# Altium schematic symbol library relay.SCHLIB: 425 symbols (part 1 of 3)
Pins are listed as number, name and electrical type; pins without a type are passive.

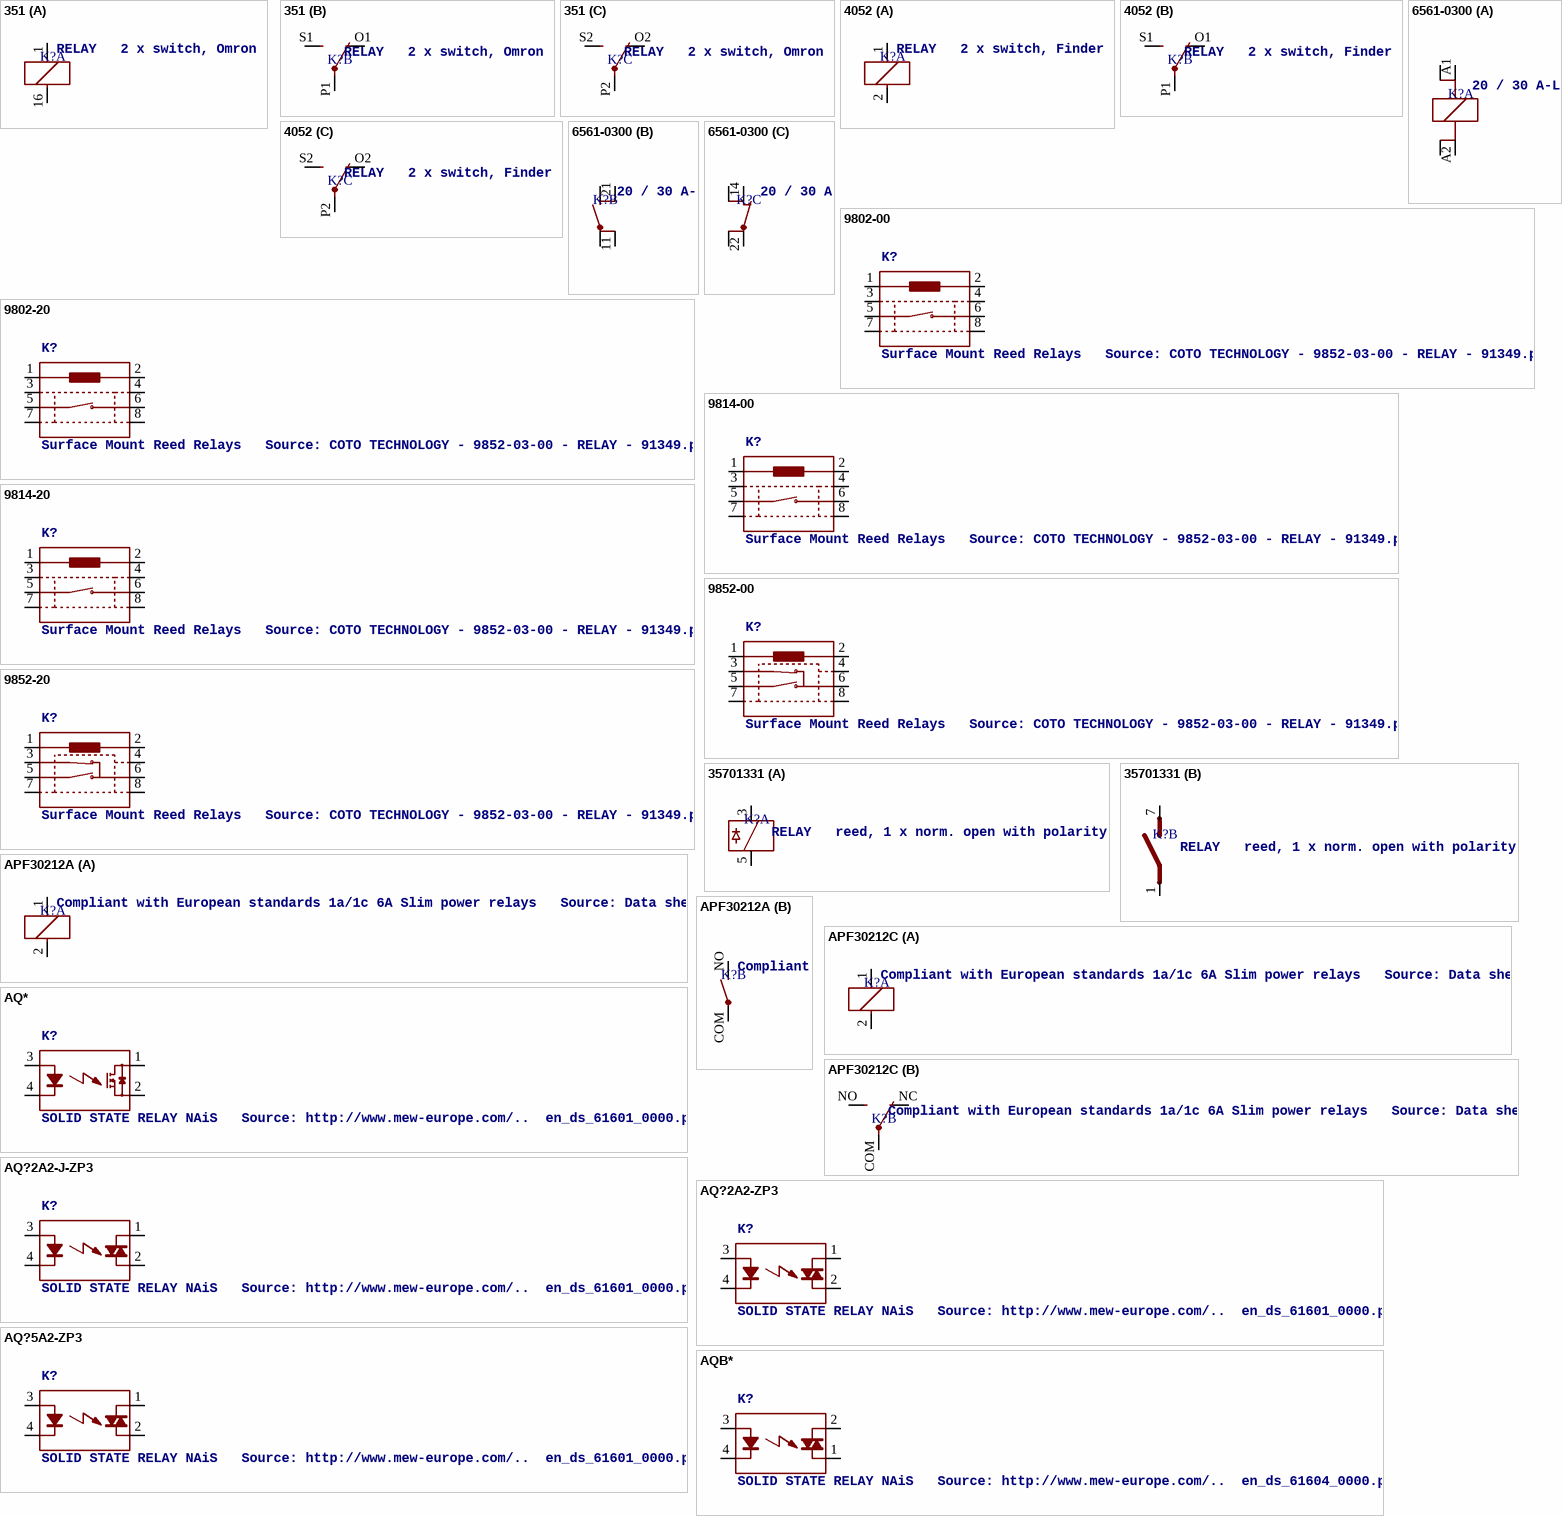
[diagram p0: symbols 351 to AQB*]

## 351
designator K?, comment RELAY   2 x switch, Omron
OC_FARNELL: unknown; OC_NEWARK: unknown
footprint 351
part A pins: 1, 16 2
part B pins: O1 O, P1 P, S1 S
part C pins: O2 O, P2 P, S2 S

## 4052
designator K?, comment RELAY   2 x switch, Finder
OC_FARNELL: unknown; OC_NEWARK: unknown
footprint F4052
part A pins: 1, 2
part B pins: O1 O, P1 P, S1 S
part C pins: O2 O, P2 P, S2 S

## 6561-0300
designator K?, comment 20 / 30 A-Leistungsrelais   Source: http://www.finder.de/comuni/pdf/S65DE.pdf
OC_FARNELL: unknown; OC_NEWARK: unknown
footprint 6561-0300
part A pins: A1 1_, A1_ 1, A2 2_, A2_ 2
part B pins: 11 P_, 11_ P, 21 S_, 21_ S
part C pins: 14 O, 14_ O_, 22 P, 22_ P_

## 9802-00
designator K?, comment Surface Mount Reed Relays   Source: COTO TECHNOLOGY - 9852-03-00 - RELAY - 91349.pdf
OC_FARNELL: unknown; OC_NEWARK: unknown; MF: COTO TECHNOLOGY; MPN: 9802-05-00; OC_FARNELL: 1081689; OC_NEWARK: 16F3689
footprint 9802-00
pins: 1, 2, 3, 4, 5, 6, 7, 8

## 9802-20
designator K?, comment Surface Mount Reed Relays   Source: COTO TECHNOLOGY - 9852-03-00 - RELAY - 91349.pdf
OC_FARNELL: unknown; OC_NEWARK: unknown; MF: COTO TECHNOLOGY; MPN: 9802-05-20; OC_FARNELL: 1081633; OC_NEWARK: 92F3367
footprint 9802-20
pins: 1, 2, 3, 4, 5, 6, 7, 8

## 9814-00
designator K?, comment Surface Mount Reed Relays   Source: COTO TECHNOLOGY - 9852-03-00 - RELAY - 91349.pdf
MF: COTO TECHNOLOGY; MPN: 9814-03-00; OC_FARNELL: unknown; OC_NEWARK: 29H2537; MPN: 9814-05-00; OC_FARNELL: 1081691; OC_NEWARK: 29H2538
footprint 9814-00
pins: 1, 2, 3, 4, 5, 6, 7, 8

## 9814-20
designator K?, comment Surface Mount Reed Relays   Source: COTO TECHNOLOGY - 9852-03-00 - RELAY - 91349.pdf
MF: COTO TECHNOLOGY; MPN: 9814-03-20; OC_FARNELL: unknown; OC_NEWARK: 83H2026; MPN: 9814-05-20; OC_NEWARK: 83H2028
footprint 9814-20
pins: 1, 2, 3, 4, 5, 6, 7, 8

## 9852-00
designator K?, comment Surface Mount Reed Relays   Source: COTO TECHNOLOGY - 9852-03-00 - RELAY - 91349.pdf
MF: COTO TECHNOLOGY; MPN: 9852-03-00; OC_FARNELL: 1081692; OC_NEWARK: 29H2540; MPN: 9852-05-00; OC_FARNELL: 1081693; OC_NEWARK: 84C8955
footprint 9852-00
pins: 1, 2, 3, 4, 5, 6, 7, 8

## 9852-20
designator K?, comment Surface Mount Reed Relays   Source: COTO TECHNOLOGY - 9852-03-00 - RELAY - 91349.pdf
MF: COTO TECHNOLOGY; MPN: 9852-03-20; OC_FARNELL: unknown; OC_NEWARK: 83H2030; MPN: 9852-05-20; OC_FARNELL: 1081642; OC_NEWARK: 46M4523
footprint 9852-20
pins: 1, 2, 3, 4, 5, 6, 7, 8

## 35701331
designator K?, comment RELAY   reed, 1 x norm. open with polarity
OC_FARNELL: unknown; OC_NEWARK: unknown
footprint REED
part A pins: 3, 5
part B pins: 1 P, 7 S

## APF30212A
designator K?, comment Compliant with European standards 1a/1c 6A Slim power relays   Source: Data sheet
OC_FARNELL: unknown
footprint APF30212A
part A pins: 1, 2
part B pins: COM P, NO S

## APF30212C
designator K?, comment Compliant with European standards 1a/1c 6A Slim power relays   Source: Data sheet
OC_FARNELL: unknown
footprint APF30212C
part A pins: 1, 2
part B pins: COM P, NC O, NO S

## AQ*
designator K?, comment SOLID STATE RELAY NAiS   Source: http://www.mew-europe.com/..  en_ds_61601_0000.pdf
MPN: AQ1AD2-3/28VDC; MPN: AQ2AD1-3/28VDC; MF: AROMAT/ MATSUSHITA; OC_FARNELL: unknown; OC_NEWARK: 10C4052; OC_NEWARK: 13P1229
footprint AQ1
pins: 1 DS1, 2 DS2, 3 A, 4 K

## AQ?2A2-J-ZP3
designator K?, comment SOLID STATE RELAY NAiS   Source: http://www.mew-europe.com/..  en_ds_61601_0000.pdf
MPN: AQ2A2-ZP3/28VDC; OC_FARNELL: 1163552; OC_NEWARK: 13P1232
footprint AQ1-FLAT
pins: 1 DS1, 2 DS2, 3 A, 4 K

## AQ?2A2-ZP3
designator K?, comment SOLID STATE RELAY NAiS   Source: http://www.mew-europe.com/..  en_ds_61601_0000.pdf
MPN: AQ2A2-ZP3/28VDC; OC_FARNELL: 1163552; OC_NEWARK: 13P1232
footprint AQ1
pins: 1 DS1, 2 DS2, 3 A, 4 K

## AQ?5A2-ZP3
designator K?, comment SOLID STATE RELAY NAiS   Source: http://www.mew-europe.com/..  en_ds_61601_0000.pdf
MPN: AQ5A2-ZP3/28VDC; OC_FARNELL: unknown; OC_NEWARK: 13P1233
footprint AQ1-M
pins: 1 DS1, 2 DS2, 3 A, 4 K

## AQB*
designator K?, comment SOLID STATE RELAY NAiS   Source: http://www.mew-europe.com/..  en_ds_61604_0000.pdf
OC_FARNELL: unknown; OC_NEWARK: unknown
footprint AQ-B
pins: 1 DS2, 2 DS1, 3 A, 4 K

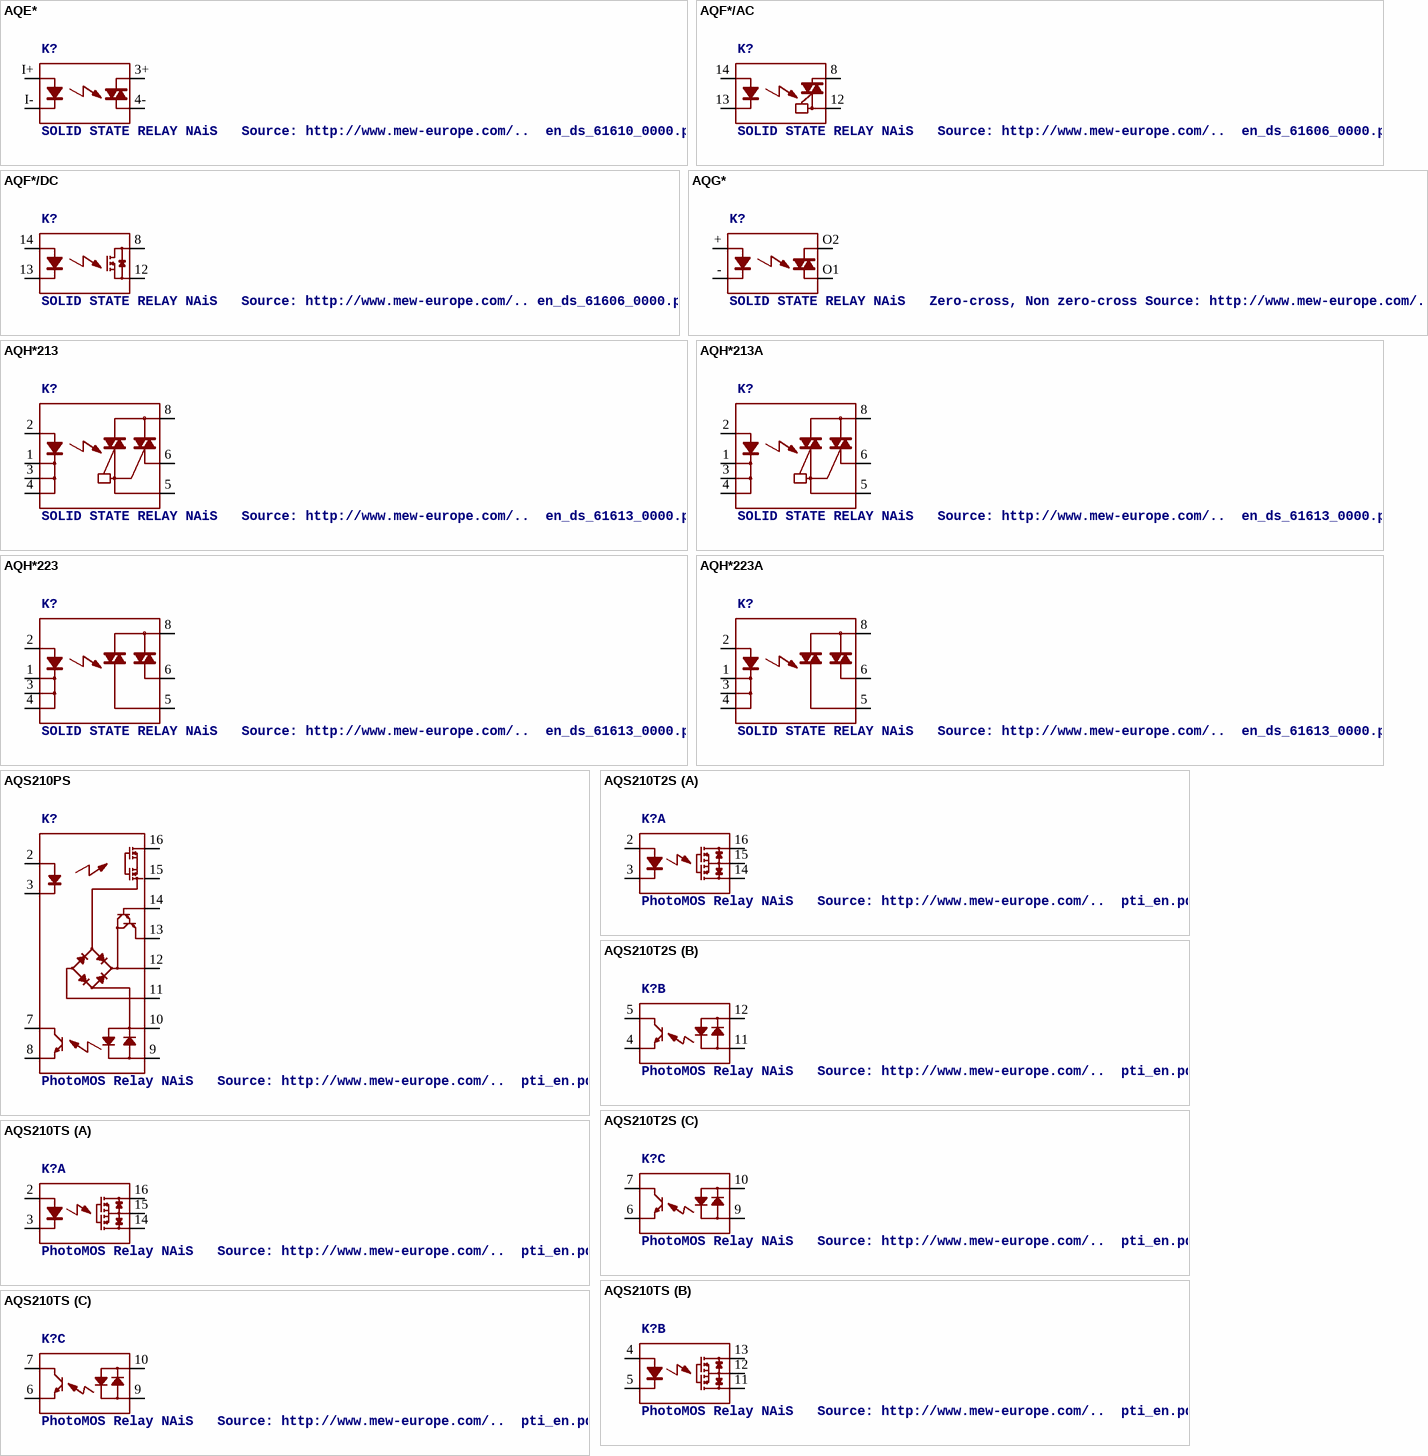
[diagram p1: symbols AQE* to AQS210TS]

## AQE*
designator K?, comment SOLID STATE RELAY NAiS   Source: http://www.mew-europe.com/..  en_ds_61610_0000.pdf
OC_FARNELL: unknown; OC_NEWARK: unknown
footprint AQE
pins: 3+ DS1, 4- DS2, I+ A, I- K

## AQF*/AC
designator K?, comment SOLID STATE RELAY NAiS   Source: http://www.mew-europe.com/..  en_ds_61606_0000.pdf
OC_FARNELL: unknown; OC_NEWARK: unknown
footprint HC2-PS-K
pins: 8 DS1, 12 DS2, 13 K, 14 A

## AQF*/DC
designator K?, comment SOLID STATE RELAY NAiS   Source: http://www.mew-europe.com/.. en_ds_61606_0000.pdf
OC_FARNELL: unknown; OC_NEWARK: unknown
footprint HC2-PS-K
pins: 8 DS1, 12 DS2, 13 K, 14 A

## AQG*
designator K?, comment SOLID STATE RELAY NAiS   Zero-cross, Non zero-cross Source: http://www.mew-europe.com/.. en_ds_61611_0000.pdf
MPN: AQG12105; MPN: AQG12112; MPN: AQG12124; MPN: AQG12205; MPN: AQG12212; MPN: AQG12224; MPN: AQG22105; MPN: AQG22124; MPN: AQG22205; MPN: AQG22212; MPN: AQG22224; MF: AROMAT/ MATSUSHITA; OC_FARNELL: unknown; OC_NEWARK: 20J4759; OC_NEWARK: 11N2581; OC_NEWARK: 11J1737; OC_NEWARK: 11N2582; OC_NEWARK: 11N2583; OC_NEWARK: 11N2584; OC_NEWARK: 13P0946; OC_NEWARK: unknown; OC_NEWARK: 11N2586; OC_NEWARK: 11N2587; OC_NEWARK: 11N2588; OC_NEWARK: 11N2589
footprint AQG
pins: + A, - K, O1 DS2, O2 DS1

## AQH*213
designator K?, comment SOLID STATE RELAY NAiS   Source: http://www.mew-europe.com/..  en_ds_61613_0000.pdf
OC_FARNELL: unknown; OC_NEWARK: unknown
footprint DIL07
pins: 1 K, 2 A, 3 K1, 4 K2, 5 DS2, 6 DS3, 8 DS1

## AQH*213A
designator K?, comment SOLID STATE RELAY NAiS   Source: http://www.mew-europe.com/..  en_ds_61613_0000.pdf
OC_FARNELL: unknown; OC_NEWARK: unknown
footprint DIL07SMD
pins: 1 K, 2 A, 3 K1, 4 K2, 5 DS2, 6 DS3, 8 DS1

## AQH*223
designator K?, comment SOLID STATE RELAY NAiS   Source: http://www.mew-europe.com/..  en_ds_61613_0000.pdf
MPN: AQH1223; MPN: AQH2223; MF: AROMAT/ MATSUSHITA; OC_FARNELL: unknown; OC_NEWARK: 54K4251; OC_NEWARK: 26K3059
footprint DIL07
pins: 1 K, 2 A, 3 K1, 4 K2, 5 DS2, 6 DS3, 8 DS1

## AQH*223A
designator K?, comment SOLID STATE RELAY NAiS   Source: http://www.mew-europe.com/..  en_ds_61613_0000.pdf
MPN: AQH1223A; MPN: AQH2223A; MF: AROMAT/ MATSUSHITA; OC_FARNELL: unknown; OC_NEWARK: 11N2601; OC_NEWARK: 26K3060
footprint DIL07SMD
pins: 1 K, 2 A, 3 K1, 4 K2, 5 DS2, 6 DS3, 8 DS1

## AQS210PS
designator K?, comment PhotoMOS Relay NAiS   Source: http://www.mew-europe.com/..  pti_en.pdf
OC_FARNELL: unknown; OC_NEWARK: unknown
footprint SOP16
pins: 2, 3, 7, 8, 9, 10, 11, 12, 13, 14, 15, 16

## AQS210T2S
designator K?, comment PhotoMOS Relay NAiS   Source: http://www.mew-europe.com/..  pti_en.pdf
OC_FARNELL: unknown; OC_NEWARK: unknown
footprint SOP16
part A pins: 2 A, 3 K, 14 D2, 15 S, 16 D1
part B pins: 4 E, 5 K, 11 AC2, 12 AC1
part C pins: 6 E, 7 K, 9 AC2, 10 AC1

## AQS210TS
designator K?, comment PhotoMOS Relay NAiS   Source: http://www.mew-europe.com/..  pti_en.pdf
OC_FARNELL: unknown; OC_NEWARK: unknown
footprint SOP16
part A pins: 2 A, 3 K, 14 D2, 15 S, 16 D1
part B pins: 4 A, 5 K, 11 D2, 12 S, 13 D1
part C pins: 6 E, 7 K, 9 AC2, 10 AC1

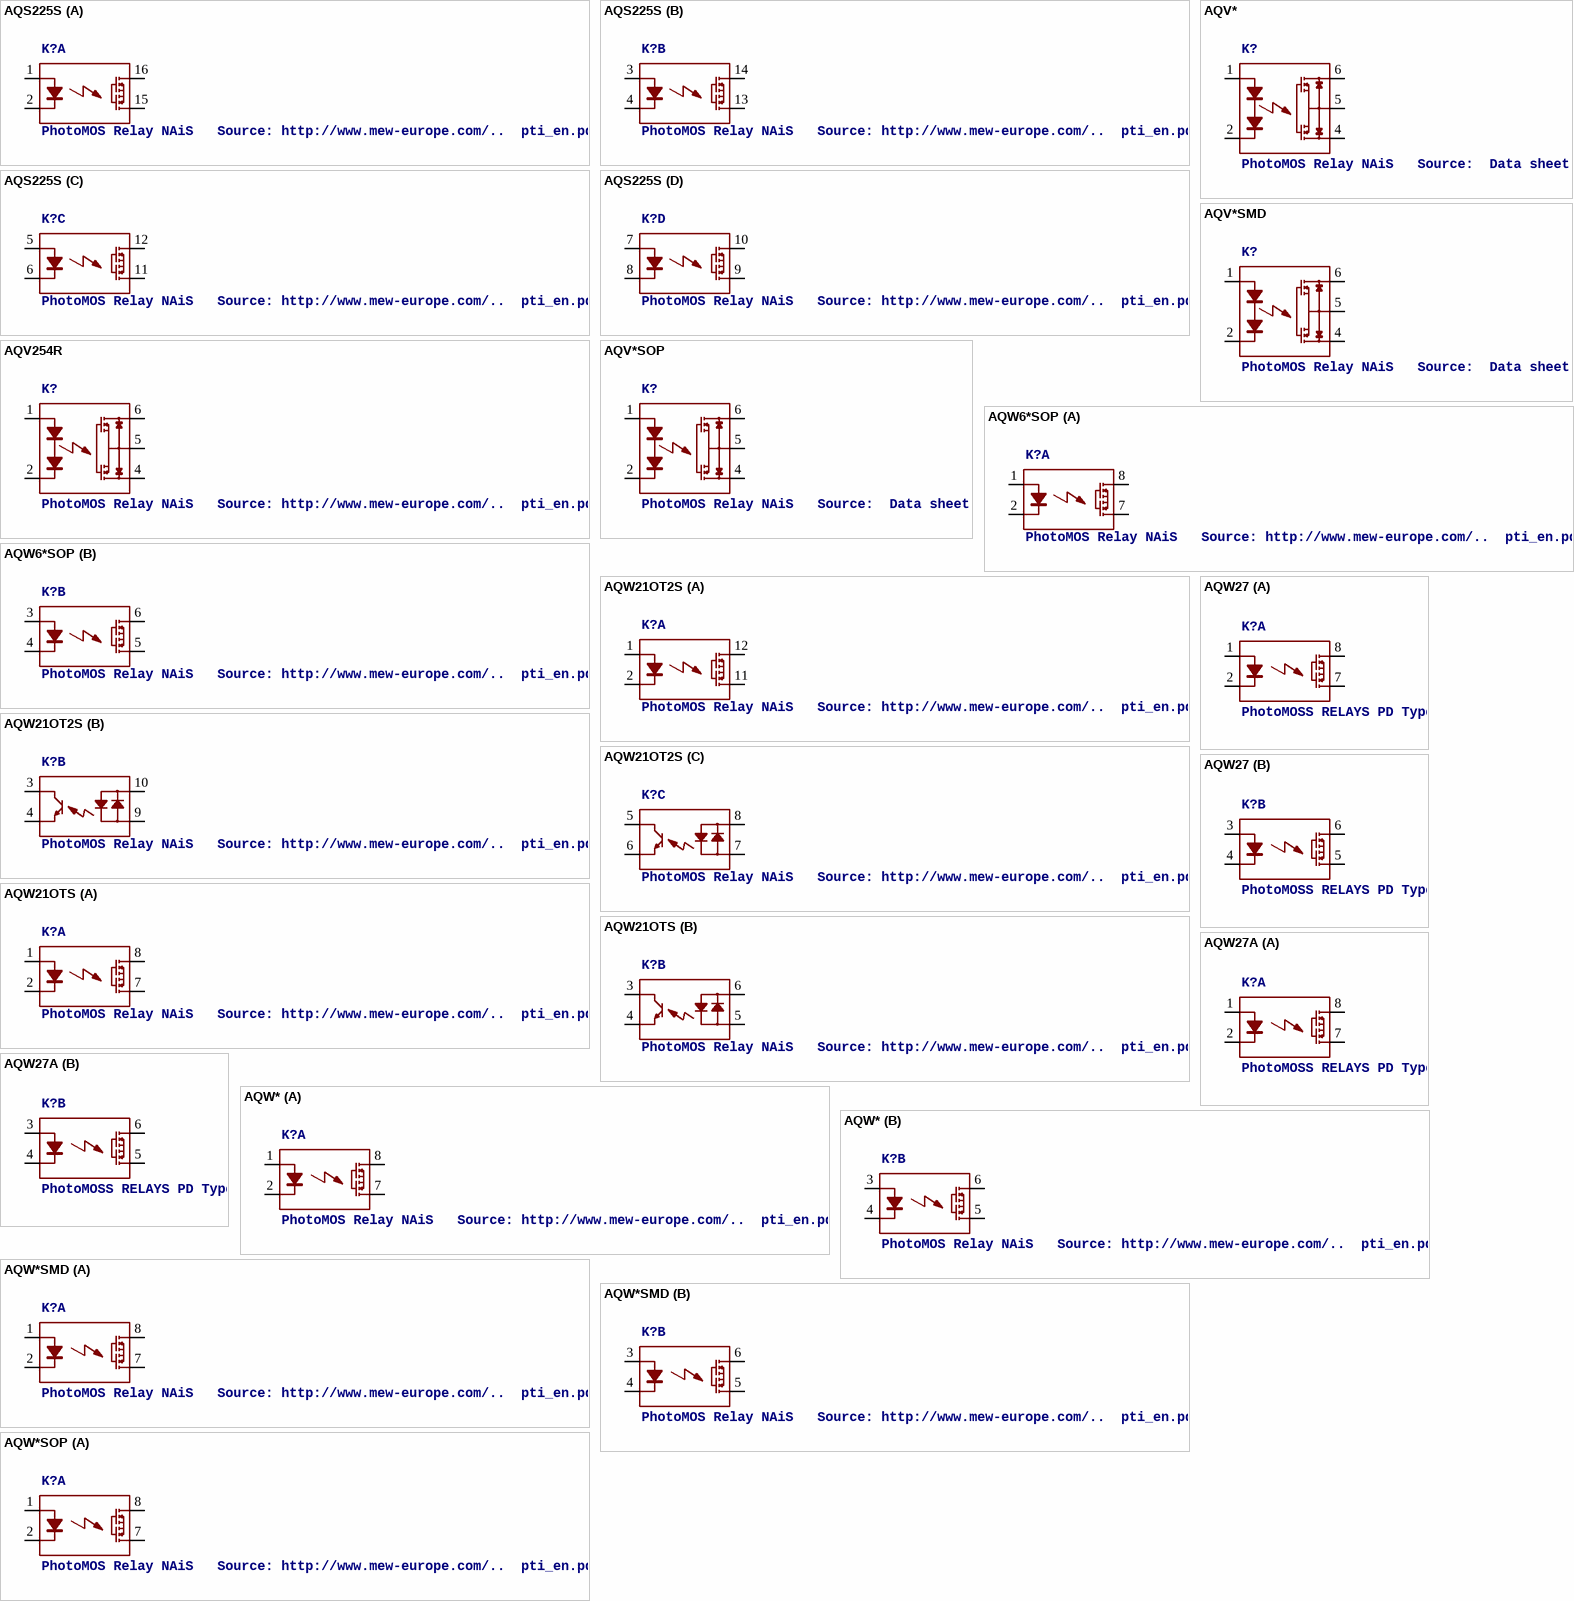
[diagram p2: symbols AQS225S to AQW*SOP]

## AQS225S
designator K?, comment PhotoMOS Relay NAiS   Source: http://www.mew-europe.com/..  pti_en.pdf
MPN: AQS225S; MF: AROMAT/ MATSUSHITA; OC_FARNELL: 1448339; OC_NEWARK: 10C3715
footprint SOP16
part A pins: 1 A, 2 K, 15 DS2, 16 DS1
part B pins: 3 A, 4 K, 13 DS2, 14 DS1
part C pins: 5 A, 6 K, 11 DS2, 12 DS1
part D pins: 7 A, 8 K, 9 DS2, 10 DS1

## AQV254R
designator K?, comment PhotoMOS Relay NAiS   Source: http://www.mew-europe.com/..  pti_en.pdf
MPN: AQV254; MF: AROMAT/ MATSUSHITA; OC_FARNELL: 1124063; OC_NEWARK: 93F6300
footprint DIL06
pins: 1 A, 2 K, 4 D2, 5 S, 6 D1

## AQV*
designator K?, comment PhotoMOS Relay NAiS   Source:  Data sheet
MPN: AQV102; MPN: AQV201; MPN: AQV210; MPN: AQV234; MF: AROMAT/ MATSUSHITA; OC_FARNELL: 2006029; OC_NEWARK: 94F8718; OC_FARNELL: 1704180; OC_NEWARK: 50F4048; OC_FARNELL: 1704179; OC_NEWARK: 13P0968; OC_FARNELL: 1414197; OC_NEWARK: unknown; OC_FARNELL: unknown; OC_NEWARK: 13P1031
footprint DIL06
pins: 1 A, 2 K, 4 D2, 5 S, 6 D1

## AQV*SMD
designator K?, comment PhotoMOS Relay NAiS   Source:  Data sheet
MPN: AQV210S; MF: AROMAT/ MATSUSHITA; OC_FARNELL: unknown; OC_NEWARK: 95F6433; OC_NEWARK: unknown
footprint DIL06SMD
pins: 1 A, 2 K, 4 D2, 5 S, 6 D1

## AQV*SOP
designator K?, comment PhotoMOS Relay NAiS   Source:  Data sheet
OC_FARNELL: unknown; OC_NEWARK: unknown
footprint SOP06
pins: 1 A, 2 K, 4 D2, 5 S, 6 D1

## AQW6*SOP
designator K?, comment PhotoMOS Relay NAiS   Source: http://www.mew-europe.com/..  pti_en.pdf
OC_FARNELL: unknown; OC_NEWARK: unknown
footprint SOP08
part A pins: 1 A, 2 K, 7 DS2, 8 DS1
part B pins: 3 A, 4 K, 5 DS2, 6 DS1

## AQW21OT2S
designator K?, comment PhotoMOS Relay NAiS   Source: http://www.mew-europe.com/..  pti_en.pdf
OC_FARNELL: unknown; OC_NEWARK: unknown
footprint SOP12
part A pins: 1 A, 2 K, 11 DS2, 12 DS1
part B pins: 3 K, 4 E, 9 AC2, 10 AC1
part C pins: 5 K, 6 E, 7 AC2, 8 AC1

## AQW21OTS
designator K?, comment PhotoMOS Relay NAiS   Source: http://www.mew-europe.com/..  pti_en.pdf
OC_FARNELL: unknown; OC_NEWARK: unknown
footprint SOP08
part A pins: 1 A, 2 K, 7 DS2, 8 DS1
part B pins: 3 K, 4 E, 5 AC2, 6 AC1

## AQW27
designator K?, comment PhotoMOSS RELAYS PD Type 2- channel (Form a) Type   Source: http://www.ic-on-line.cn/IOL/datasheet/aqw277az_1212830.pdf
footprint AQW27-DIL08
part A pins: 1 A, 2 K, 7 D2, 8 D1
part B pins: 3 A, 4 K, 5 D2, 6 D1

## AQW27A
designator K?, comment PhotoMOSS RELAYS PD Type 2- channel (Form a) Type   Source: http://www.ic-on-line.cn/IOL/datasheet/aqw277az_1212830.pdf
footprint AQW27-SMD08
part A pins: 1 A, 2 K, 7 D2, 8 D1
part B pins: 3 A, 4 K, 5 D2, 6 D1

## AQW*
designator K?, comment PhotoMOS Relay NAiS   Source: http://www.mew-europe.com/..  pti_en.pdf
MPN: AQW654; OC_FARNELL: unknown; OC_NEWARK: unknown; OC_NEWARK: 13P1160
footprint DIL08
part A pins: 1 A, 2 K, 7 D2, 8 D1
part B pins: 3 A, 4 K, 5 D2, 6 D1

## AQW*SMD
designator K?, comment PhotoMOS Relay NAiS   Source: http://www.mew-europe.com/..  pti_en.pdf
MPN: AQW654; MF: AROMAT/ MATSUSHITA; OC_FARNELL: unknown; OC_NEWARK: 98B6279
footprint DIL08SMD
part A pins: 1 A, 2 K, 7 D2, 8 D1
part B pins: 3 A, 4 K, 5 D2, 6 D1

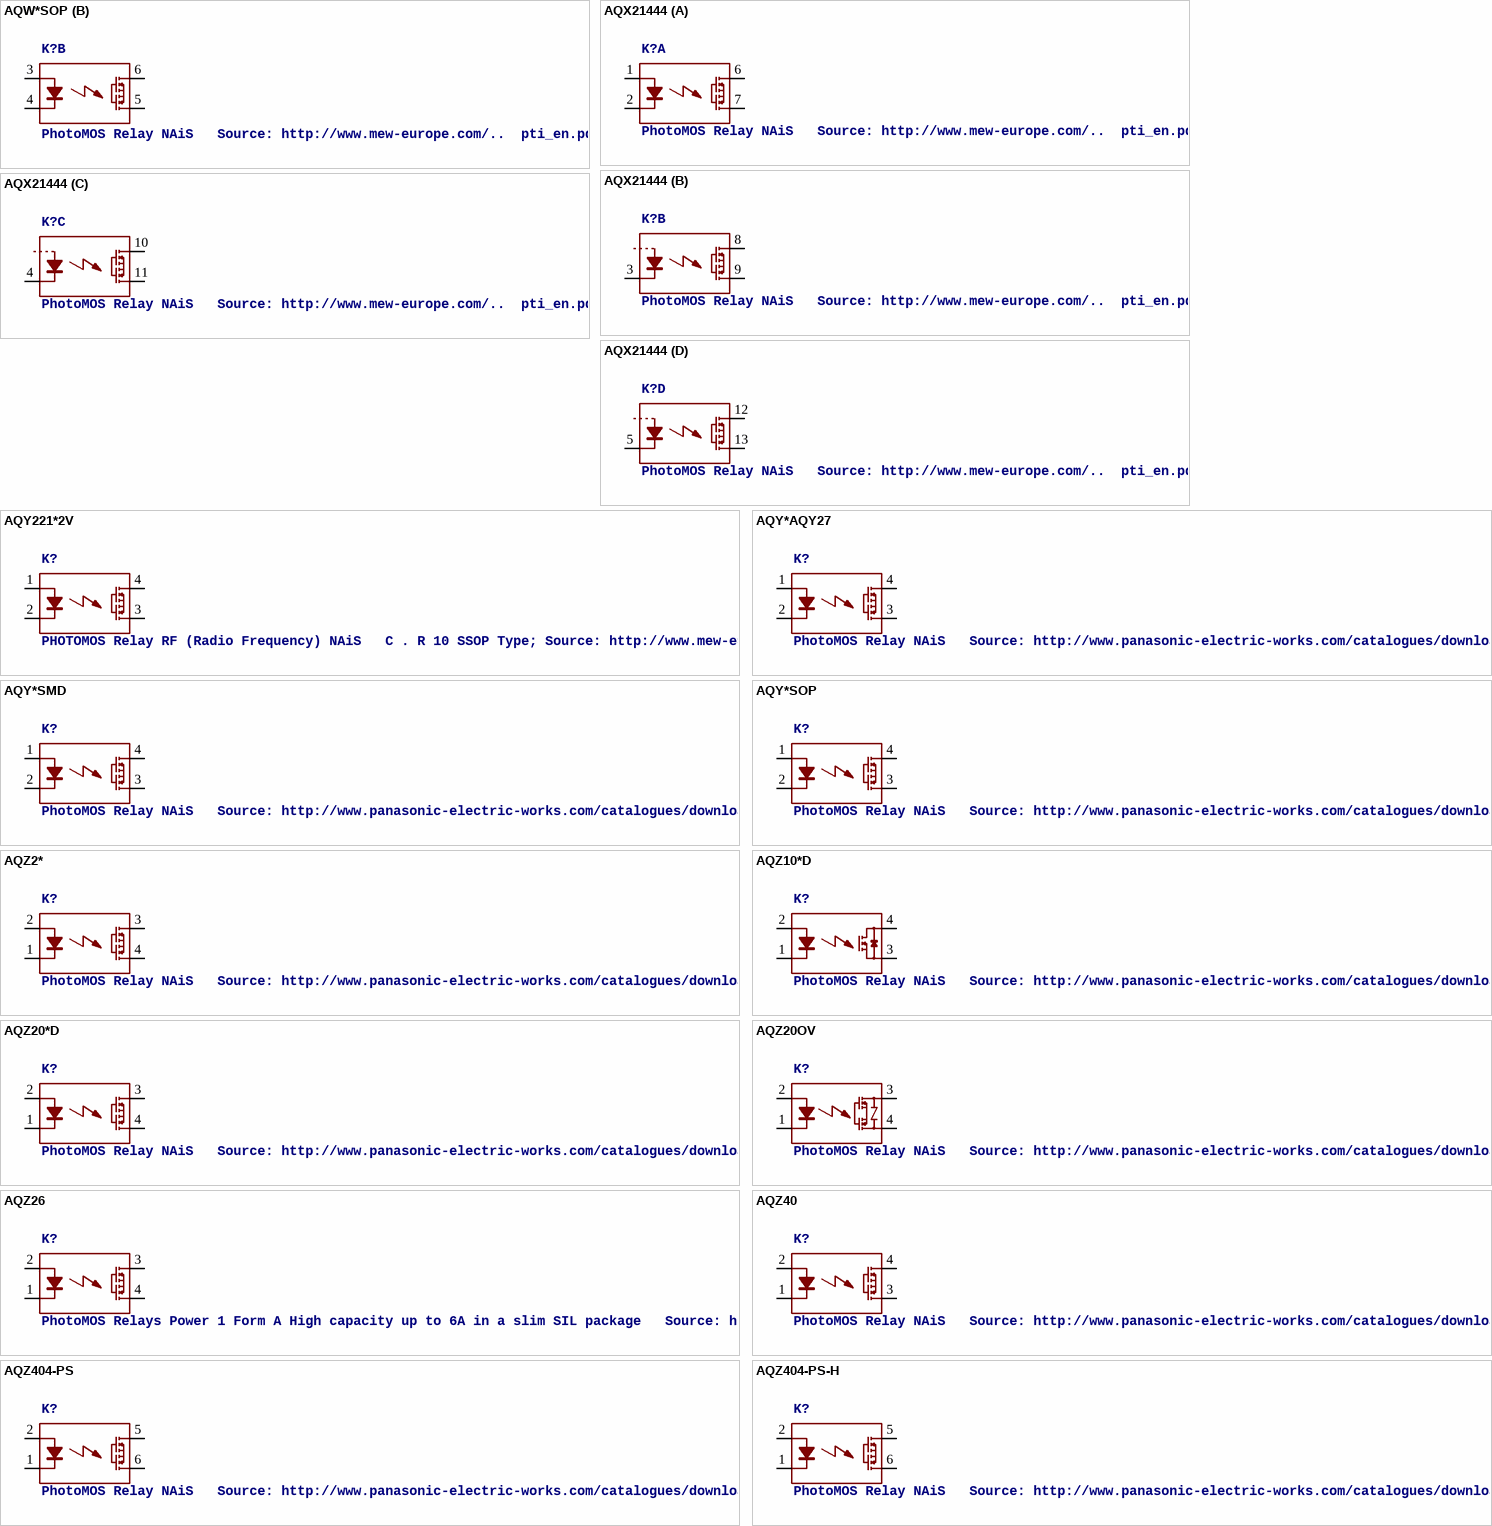
[diagram p3: symbols AQW*SOP to AQZ404-PS-H]

## AQW*SOP
designator K?, comment PhotoMOS Relay NAiS   Source: http://www.mew-europe.com/..  pti_en.pdf
OC_FARNELL: unknown; OC_NEWARK: unknown
footprint SOP08
part A pins: 1 A, 2 K, 7 D2, 8 D1
part B pins: 3 A, 4 K, 5 D2, 6 D1

## AQX21444
designator K?, comment PhotoMOS Relay NAiS   Source: http://www.mew-europe.com/..  pti_en.pdf
OC_FARNELL: unknown; OC_NEWARK: unknown
footprint SIL13
part A pins: 1 A, 2 K, 6 DS1, 7 DS2
part B pins: 3 K, 8 DS1, 9 DS2
part C pins: 4 K, 10 DS1, 11 DS2
part D pins: 5 K, 12 DS1, 13 DS2

## AQY221*2V
designator K?, comment PHOTOMOS Relay RF (Radio Frequency) NAiS   C . R 10 SSOP Type; Source: http://www.mew-europe.com/.. aqy221_2v.pdf
MPN: AQY221N2V; MPN: AQY221R2V; MF: AROMAT/ MATSUSHITA; OC_FARNELL: 1448344; OC_NEWARK: 13P1186; OC_FARNELL: 1839014; OC_NEWARK: 94C1062
footprint SSOP4
pins: 1 A, 2 K, 3 DS2, 4 DS1

## AQY*AQY27
designator K?, comment PhotoMOS Relay NAiS   Source: http://www.panasonic-electric-works.com/catalogues/downloads/photomos/ds_x615_en_aqz10_20.pdf
OC_FARNELL: unknown; OC_NEWARK: unknown
footprint AQY27
pins: 1 A, 2 K, 3 DS2, 4 DS1

## AQY*SMD
designator K?, comment PhotoMOS Relay NAiS   Source: http://www.panasonic-electric-works.com/catalogues/downloads/photomos/ds_x615_en_aqz10_20.pdf
OC_FARNELL: unknown; OC_NEWARK: unknown
footprint AQY27-SMD04
pins: 1 A, 2 K, 3 DS2, 4 DS1

## AQY*SOP
designator K?, comment PhotoMOS Relay NAiS   Source: http://www.panasonic-electric-works.com/catalogues/downloads/photomos/ds_x615_en_aqz10_20.pdf
OC_FARNELL: unknown; OC_NEWARK: unknown
footprint SOP04
pins: 1 A, 2 K, 3 DS2, 4 DS1

## AQZ2*
designator K?, comment PhotoMOS Relay NAiS   Source: http://www.panasonic-electric-works.com/catalogues/downloads/photomos/ds_x615_en_aqz10_20.pdf
OC_FARNELL: unknown; OC_NEWARK: unknown
footprint AQZ-SIL04
pins: 1 K, 2 A, 3 DS1, 4 DS2

## AQZ10*D
designator K?, comment PhotoMOS Relay NAiS   Source: http://www.panasonic-electric-works.com/catalogues/downloads/photomos/ds_x615_en_aqz10_20.pdf
MPN: AQZ102D; MPN: AQZ104; MPN: AQZ105; MPN: AQZ107; MF: AROMAT/ MATSUSHITA; OC_FARNELL: 1448345; OC_NEWARK: 10C4038; OC_FARNELL: unknown; OC_NEWARK: 13P1217; OC_NEWARK: 10C4041; OC_NEWARK: 50B844
footprint AQZ-SIL04
pins: 1 K, 2 A, 3 DS2, 4 DS1

## AQZ20*D
designator K?, comment PhotoMOS Relay NAiS   Source: http://www.panasonic-electric-works.com/catalogues/downloads/photomos/ds_x615_en_aqz10_20.pdf
MPN: AQZ202D; MPN: AQZ204D; MPN: AQZ205D; MPN: AQZ207; MF: AROMAT/ MATSUSHITA; OC_FARNELL: 2053925; OC_NEWARK: 10C4043; OC_FARNELL: unknown; OC_NEWARK: 10C4045; OC_FARNELL: 1175736; OC_NEWARK: 10C4047; OC_FARNELL: 1129299; OC_NEWARK: 64K3058
footprint AQZ-SIL04
pins: 1 K, 2 A, 3 DS1, 4 DS2

## AQZ20OV
designator K?, comment PhotoMOS Relay NAiS   Source: http://www.panasonic-electric-works.com/catalogues/downloads/photomos/ds_x615_en_aqz10_20.pdf
OC_FARNELL: unknown; OC_NEWARK: unknown
footprint AQZ-SIL04
pins: 1 K, 2 A, 3 DS1, 4 DS2

## AQZ26
designator K?, comment PhotoMOS Relays Power 1 Form A High capacity up to 6A in a slim SIL package   Source: http://www.panasonic-electric-works.com/catalogues/downloads/photomos/ds_x615_en_aqz262_264.pdf
footprint AQZ26-SIL04
pins: 1 K, 2 A, 3 DS1, 4 DS2

## AQZ40
designator K?, comment PhotoMOS Relay NAiS   Source: http://www.panasonic-electric-works.com/catalogues/downloads/photomos/ds_x615_en_aqz10_20.pdf
OC_FARNELL: unknown; OC_NEWARK: unknown
footprint AQZ-SIL04
pins: 1 K, 2 A, 3 DS2, 4 DS1

## AQZ404-PS
designator K?, comment PhotoMOS Relay NAiS   Source: http://www.panasonic-electric-works.com/catalogues/downloads/photomos/ds_x615_en_aqz10_20.pdf
MPN: AQZ404; OC_FARNELL: 1101853; OC_NEWARK: 13P1226
footprint AQZ404-PS
pins: 1 K, 2 A, 5 DS1, 6 DS2

## AQZ404-PS-H
designator K?, comment PhotoMOS Relay NAiS   Source: http://www.panasonic-electric-works.com/catalogues/downloads/photomos/ds_x615_en_aqz10_20.pdf
MPN: AQZ404; OC_FARNELL: 1101853; OC_NEWARK: 13P1226
footprint AQZ404-PS-H
pins: 1 K, 2 A, 5 DS1, 6 DS2

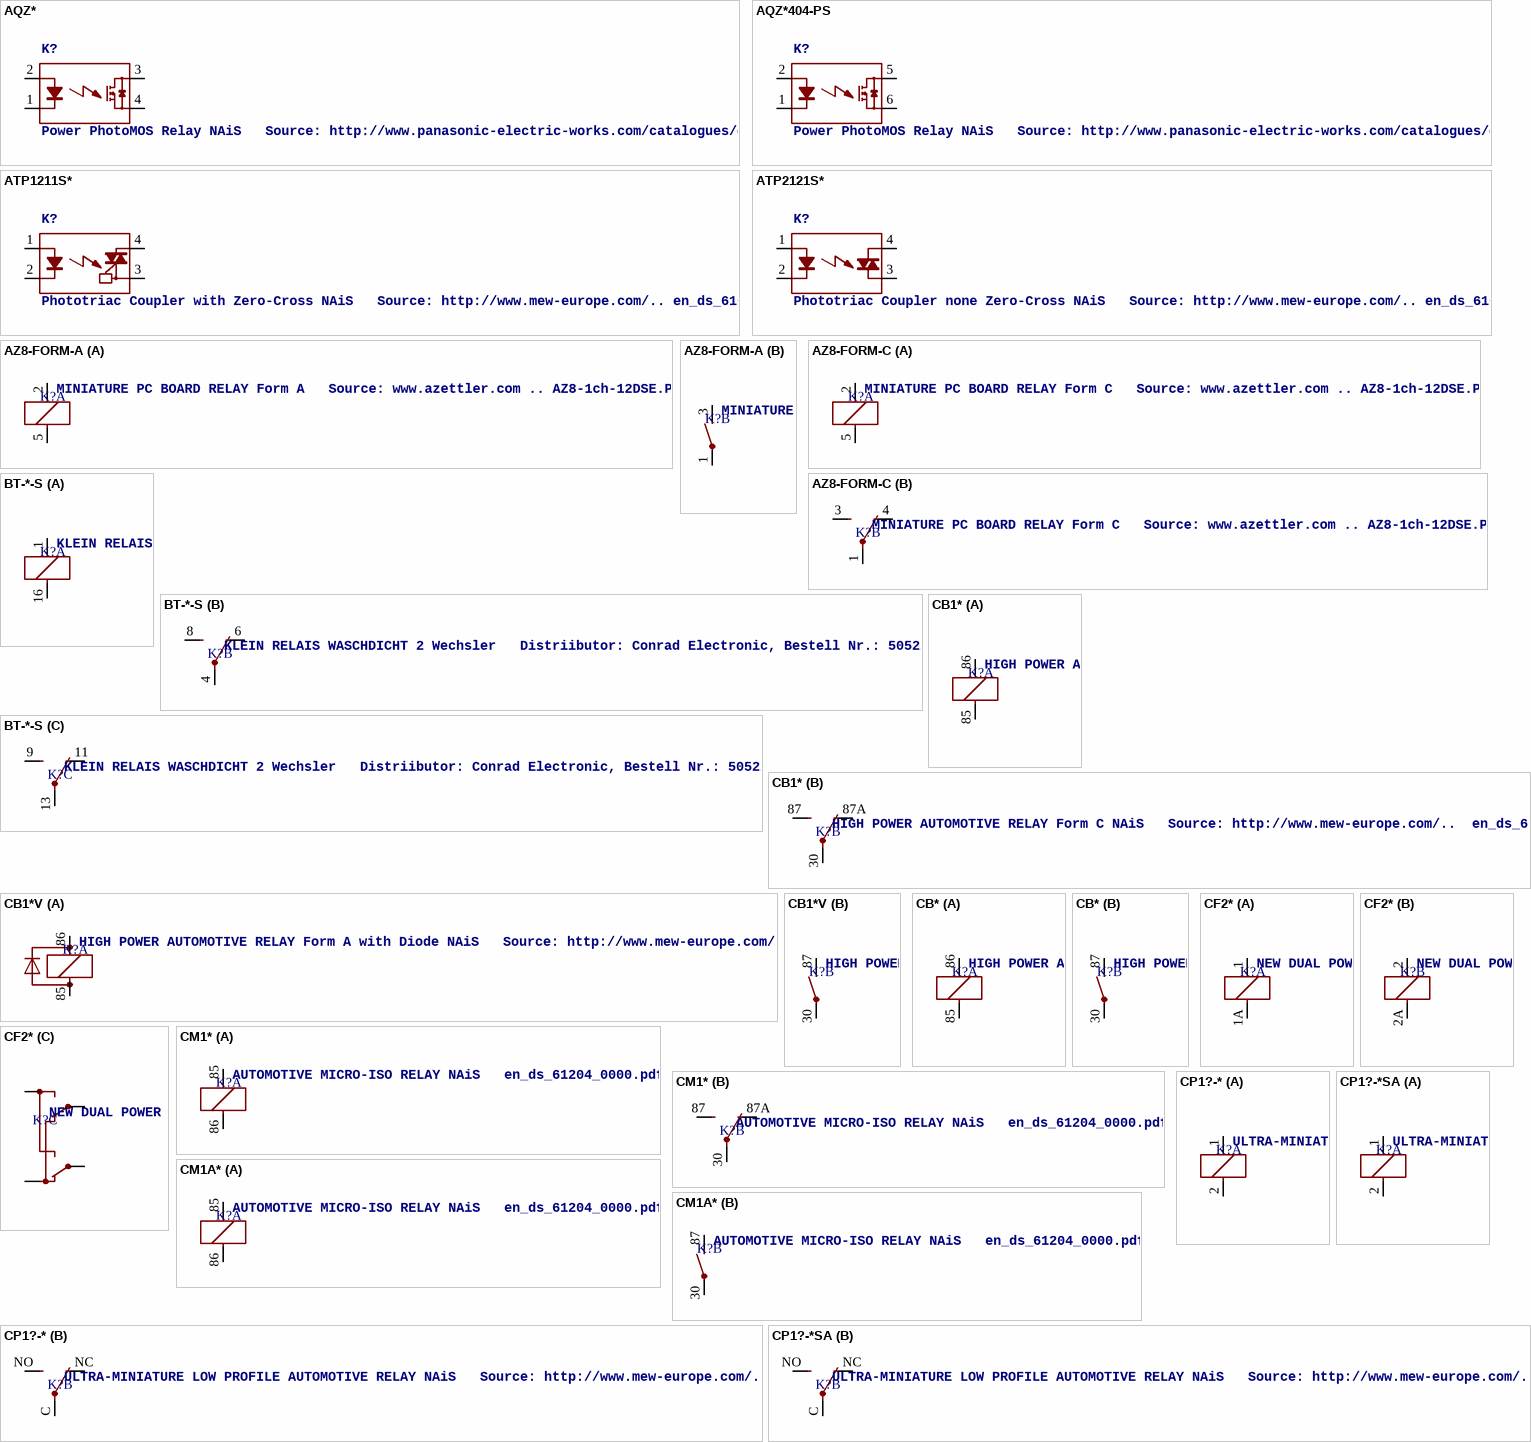
[diagram p4: symbols AQZ* to CP1?-*SA]
